# Altium footprint library ref-packages.PCBLIB: 1544 footprints (part 66 of 103)
Each footprint in its own frame and in the unit in brackets; x right, y up, seen from the top. Pads: shape width x height; smd on the part's side, far side on the other; paste and mask are expansions set on the pad; w line width, h text height; cw(c..) or ccw(c..) is an arc to the next point about the centre after c.
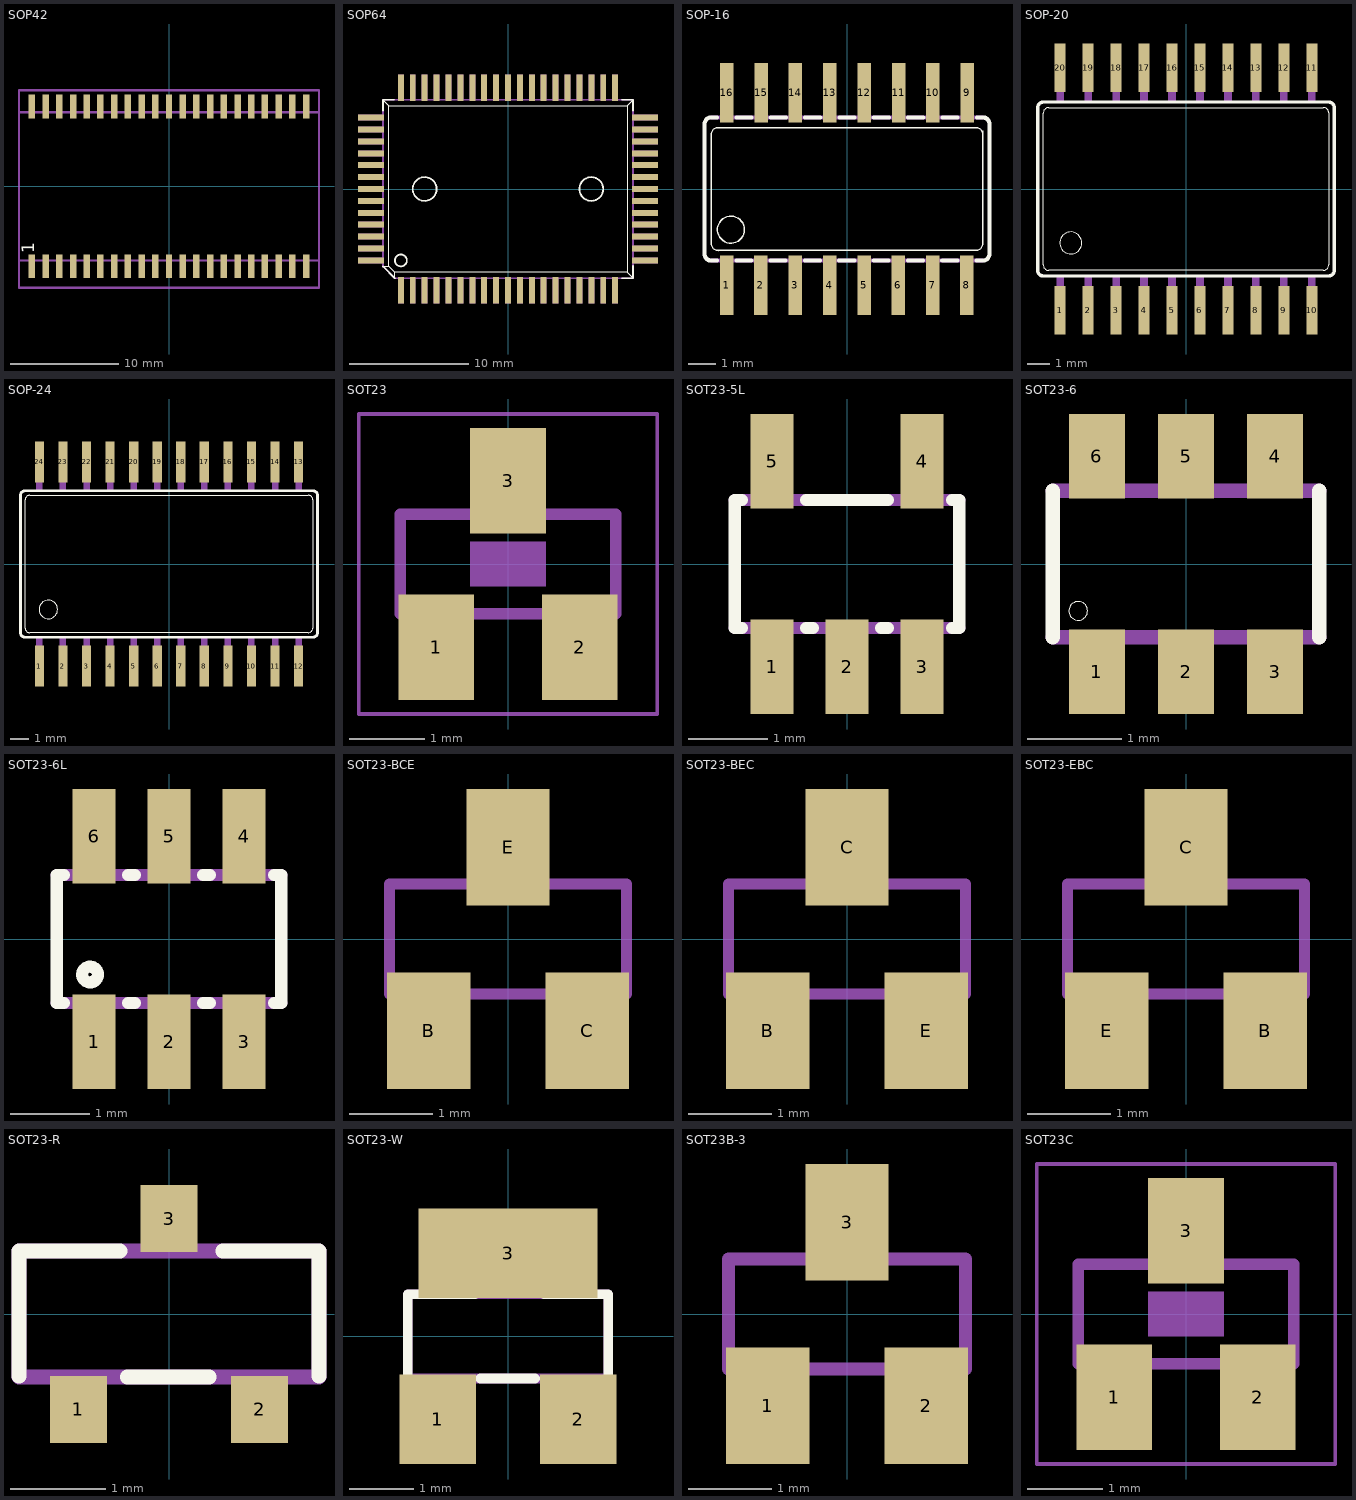
[diagram p65: the footprints below, top view; thin cyan lines are the x and y axes]

## SOP42 [mil]
pads (42):
  rect 23.62x86.61 smd: 1(-500,-291.34) 2(-450,-291.34) 3(-400,-291.34) 4(-350,-291.34) 5(-300,-291.34) 6(-250,-291.34) 7(-200,-291.34) 8(-150,-291.34) 9(-100,-291.34) 10(-50,-291.34) 11(0,-291.34) 12(50,-291.34) 13(100,-291.34) 14(150,-291.34) 15(200,-291.34) 16(250,-291.34) 17(300,-291.34) 18(350,-291.34) 19(400,-291.34) 20(450,-291.34) 21(500,-291.34) 22(500,291.34) 23(450,291.34) 24(400,291.34) 25(350,291.34) 26(300,291.34) 27(250,291.34) 28(200,291.34) 29(150,291.34) 30(100,291.34) 31(50,291.34) 32(0,291.34) 33(-50,291.34) 34(-100,291.34) 35(-150,291.34) 36(-200,291.34) 37(-250,291.34) 38(-300,291.34) 39(-350,291.34) 40(-400,291.34) 41(-450,291.34) 42(-500,291.34)
Top Overlay:
  text "1" at -475,-244.69 h77.5
Mechanical 16:
  rectangle: -509.65,-324.8 -490.35,-274.41
  rectangle: -459.65,-324.8 -440.35,-274.41
  rectangle: -409.65,-324.8 -390.35,-274.41
  rectangle: -359.65,-324.8 -340.35,-274.41
  rectangle: -309.65,-324.8 -290.35,-274.41
  rectangle: -259.65,-324.8 -240.35,-274.41
  rectangle: -209.65,-324.8 -190.35,-274.41
  rectangle: -159.65,-324.8 -140.35,-274.41
  rectangle: -109.65,-324.8 -90.35,-274.41
  rectangle: -59.65,-324.8 -40.35,-274.41
  rectangle: -9.65,-324.8 9.65,-274.41
  rectangle: 40.35,-324.8 59.65,-274.41
  rectangle: 90.35,-324.8 109.65,-274.41
  rectangle: 140.35,-324.8 159.65,-274.41
  rectangle: 190.35,-324.8 209.65,-274.41
  rectangle: 240.35,-324.8 259.65,-274.41
  rectangle: 290.35,-324.8 309.65,-274.41
  rectangle: 340.35,-324.8 359.65,-274.41
  rectangle: 390.35,-324.8 409.65,-274.41
  rectangle: 440.35,-324.8 459.65,-274.41
  rectangle: 490.35,-324.8 509.65,-274.41
  rectangle: 490.35,274.41 509.65,324.8
  rectangle: 440.35,274.41 459.65,324.8
  rectangle: 390.35,274.41 409.65,324.8
  rectangle: 340.35,274.41 359.65,324.8
  rectangle: 290.35,274.41 309.65,324.8
  rectangle: 240.35,274.41 259.65,324.8
  rectangle: 190.35,274.41 209.65,324.8
  rectangle: 140.35,274.41 159.65,324.8
  rectangle: 90.35,274.41 109.65,324.8
  rectangle: 40.35,274.41 59.65,324.8
  rectangle: -9.65,274.41 9.65,324.8
  rectangle: -59.65,274.41 -40.35,324.8
  rectangle: -109.65,274.41 -90.35,324.8
  rectangle: -159.65,274.41 -140.35,324.8
  rectangle: -209.65,274.41 -190.35,324.8
  rectangle: -259.65,274.41 -240.35,324.8
  rectangle: -309.65,274.41 -290.35,324.8
  rectangle: -359.65,274.41 -340.35,324.8
  rectangle: -409.65,274.41 -390.35,324.8
  rectangle: -459.65,274.41 -440.35,324.8
  rectangle: -509.65,274.41 -490.35,324.8
  lines w8: -547.24,-270.47 547.24,-270.47 547.24,270.47 -547.24,270.47 -547.24,-270.47
Mechanical 27:
  lines w7.87: -547.24,-370.08 -547.24,350.39 547.24,350.39 547.24,-370.08 -547.24,-370.08

## SOP64 [mm]
pads (64):
  rect 0.5x2.2 smd: 1(-9,-8.5) 2(-8,-8.5) 3(-7,-8.5) 4(-6,-8.5) 5(-5,-8.5) 6(-4,-8.5) 7(-3,-8.5) 8(-2,-8.5) 9(-1,-8.5) 10(0,-8.5) 11(1,-8.5) 12(2,-8.5) 13(3,-8.5) 14(4,-8.5) 15(5,-8.5) 16(6,-8.5) 17(7,-8.5) 18(8,-8.5) 19(9,-8.5) 33(9,8.5) 34(8,8.5) 35(7,8.5) 36(6,8.5) 37(5,8.5) 38(4,8.5) 39(3,8.5) 40(2,8.5) 41(1,8.5) 42(0,8.5) 43(-1,8.5) 44(-2,8.5) 45(-3,8.5) 46(-4,8.5) 47(-5,8.5) 48(-6,8.5) 49(-7,8.5) 50(-8,8.5) 51(-9,8.5)
  rect 2.2x0.5 smd: 20(11.5,-6) 21(11.5,-5) 22(11.5,-4) 23(11.5,-3) 24(11.5,-2) 25(11.5,-1) 26(11.5,0) 27(11.5,1) 28(11.5,2) 29(11.5,3) 30(11.5,4) 31(11.5,5) 32(11.5,6) 52(-11.5,6) 53(-11.5,5) 54(-11.5,4) 55(-11.5,3) 56(-11.5,2) 57(-11.5,1) 58(-11.5,0) 59(-11.5,-1) 60(-11.5,-2) 61(-11.5,-3) 62(-11.5,-4) 63(-11.5,-5) 64(-11.5,-6)
Top Overlay:
  circle w0.152: c-9,-6 r0.5
  circle w0.152: c-7,0 r1
  circle w0.152: c7,0 r1
  lines w0.051: -10.5,-6.5 -10,-6.5 ; -10.5,7.5 -10,7 ; -9.5,-7.5 -9.5,-7 ; 10.5,-7.5 10,-7 ; 10.5,7.5 10,7 ; -10,-6.5 -9.5,-7 ; -10,-6.5 -10,7 ; -10,7 10,7 ; -9.5,-7 10,-7 ; 10,-7 10,7
  lines w0.152: -10.5,-6.5 -9.5,-7.5 ; -10.5,6.581 -10.5,7.5 -9.566,7.5 ; 9.55,-7.5 10.5,-7.5 10.5,-6.47 ; 9.566,7.5 10.5,7.5 10.5,6.597
Mechanical 16:
  rectangle: -9.25,7.55 -8.75,9.6
  rectangle: -8.25,7.55 -7.75,9.6
  rectangle: -7.25,7.55 -6.75,9.6
  rectangle: -6.25,7.55 -5.75,9.6
  rectangle: -5.25,7.55 -4.75,9.6
  rectangle: -4.25,7.55 -3.75,9.6
  rectangle: -3.25,7.55 -2.75,9.6
  rectangle: -2.25,7.55 -1.75,9.6
  rectangle: -1.25,7.55 -0.75,9.6
  rectangle: -0.25,7.55 0.25,9.6
  rectangle: 0.75,7.55 1.25,9.6
  rectangle: 1.75,7.55 2.25,9.6
  rectangle: 2.75,7.55 3.25,9.6
  rectangle: 3.75,7.55 4.25,9.6
  rectangle: 4.75,7.55 5.25,9.6
  rectangle: 5.75,7.55 6.25,9.6
  rectangle: 6.75,7.55 7.25,9.6
  rectangle: 7.75,7.55 8.25,9.6
  rectangle: 8.75,7.55 9.25,9.6
  rectangle: 10.55,5.75 12.6,6.25
  rectangle: 10.55,4.75 12.6,5.25
  rectangle: 10.55,3.75 12.6,4.25
  rectangle: 10.55,2.75 12.6,3.25
  rectangle: 10.55,1.75 12.6,2.25
  rectangle: 10.55,0.75 12.6,1.25
  rectangle: 10.55,-0.25 12.6,0.25
  rectangle: 10.55,-1.25 12.6,-0.75
  rectangle: 10.55,-2.25 12.6,-1.75
  rectangle: 10.55,-3.25 12.6,-2.75
  rectangle: 10.55,-4.25 12.6,-3.75
  rectangle: 10.55,-5.25 12.6,-4.75
  rectangle: 10.55,-6.25 12.6,-5.75
  rectangle: 8.75,-9.6 9.25,-7.55
  rectangle: 7.75,-9.6 8.25,-7.55
  rectangle: 6.75,-9.6 7.25,-7.55
  rectangle: 5.75,-9.6 6.25,-7.55
  rectangle: 4.75,-9.6 5.25,-7.55
  rectangle: 3.75,-9.6 4.25,-7.55
  rectangle: 2.75,-9.6 3.25,-7.55
  rectangle: 1.75,-9.6 2.25,-7.55
  rectangle: 0.75,-9.6 1.25,-7.55
  rectangle: -0.25,-9.6 0.25,-7.55
  rectangle: -1.25,-9.6 -0.75,-7.55
  rectangle: -2.25,-9.6 -1.75,-7.55
  rectangle: -3.25,-9.6 -2.75,-7.55
  rectangle: -4.25,-9.6 -3.75,-7.55
  rectangle: -5.25,-9.6 -4.75,-7.55
  rectangle: -6.25,-9.6 -5.75,-7.55
  rectangle: -7.25,-9.6 -6.75,-7.55
  rectangle: -8.25,-9.6 -7.75,-7.55
  rectangle: -9.25,-9.6 -8.75,-7.55
  rectangle: -12.6,-6.25 -10.55,-5.75
  rectangle: -12.6,-5.25 -10.55,-4.75
  rectangle: -12.6,-4.25 -10.55,-3.75
  rectangle: -12.6,-3.25 -10.55,-2.75
  rectangle: -12.6,-2.25 -10.55,-1.75
  rectangle: -12.6,-1.25 -10.55,-0.75
  rectangle: -12.6,-0.25 -10.55,0.25
  rectangle: -12.6,0.75 -10.55,1.25
  rectangle: -12.6,1.75 -10.55,2.25
  rectangle: -12.6,2.75 -10.55,3.25
  rectangle: -12.6,3.75 -10.55,4.25
  rectangle: -12.6,4.75 -10.55,5.25
  rectangle: -12.6,5.75 -10.55,6.25
  lines w0.152: -10.5,-6.5 -10.5,7.5 10.5,7.5 10.5,-7.5 -9.5,-7.5 -10.5,-6.5

## SOP-16 [mil]
pads (16):
  rect 19.69x86.61 smd: 1(-175,-139.76) 2(-125.39,-139.76) 3(-75.39,-139.76) 4(-25.39,-139.76) 5(25,-139.76) 6(74.61,-139.76) 7(124.61,-139.76) 8(174.61,-139.76) 9(175,139.76) 10(125,139.76) 11(75,139.76) 12(25,139.76) 13(-25,139.76) 14(-75,139.76) 15(-125,139.76) 16(-175,139.76)
Top Overlay:
  circle w2: c-168.9,-59.06 r19.69
  lines w2: -187.8,-89.49 187.6,-89.49 ccw(c187.6,-79.65) 197.44,-79.65 197.44,79.65 ; -187.6,-89.61 cw(c-187.59,-79.77) -197.44,-79.76 -197.44,79.65 cw(c-187.59,79.65) -187.56,89.5 187.6,89.49 cw(c187.6,79.65) 197.44,79.65 ; 197.44,84.65 197.44,79.65
  lines w6: -198.82,104.33 -189.02,104.33 ; -197.44,-104.33 cw(c-197.54,-94.33) -197.64,-104.33 ; -197.44,104.33 ccw(c-197.44,94.49) -207.28,94.49 -207.28,-94.49 ccw(c-197.44,-94.49) -197.64,-104.33 ; -189.02,-104.33 -197.64,-104.33 ; -160.98,-104.33 -139.41,-104.33 ; -160.98,104.33 -139.02,104.33 ; -111.38,-104.33 -89.41,-104.33 ; -110.98,104.33 -89.02,104.33 ; -61.38,-104.33 -39.41,-104.33 ; -60.98,104.33 -39.02,104.33 ; -11.38,-104.33 10.98,-104.33 ; -10.98,104.33 10.98,104.33 ; 39.02,-104.33 60.59,-104.33 ; 39.02,104.33 60.98,104.33 ; 88.62,-104.33 110.59,-104.33 ; 89.02,104.33 110.98,104.33 ; 138.62,-104.33 160.59,-104.33 ; 139.02,104.33 160.98,104.33 ; 188.62,-104.33 197.24,-104.33 ; 189.02,104.33 197.64,104.33 ; 197.44,-104.33 ccw(c197.44,-94.49) 207.28,-94.49 207.28,94.49 ccw(c197.44,94.49) 197.64,104.33 ; 197.44,104.33 cw(c197.54,94.33) 197.64,104.33
Mechanical 16:
  rectangle: -182.87,104.33 -167.13,159.45
  rectangle: -132.87,104.33 -117.13,159.45
  rectangle: -82.87,104.33 -67.13,159.45
  rectangle: -32.87,104.33 -17.13,159.45
  rectangle: 17.13,104.33 32.87,159.45
  rectangle: 67.13,104.33 82.87,159.45
  rectangle: 117.13,104.33 132.87,159.45
  rectangle: 167.13,104.33 182.87,159.45
  rectangle: 166.73,-159.45 182.48,-104.33
  rectangle: 116.73,-159.45 132.48,-104.33
  rectangle: 66.73,-159.45 82.48,-104.33
  rectangle: 17.13,-159.45 32.87,-104.33
  rectangle: -33.27,-159.45 -17.52,-104.33
  rectangle: -83.27,-159.45 -67.52,-104.33
  rectangle: -133.27,-159.45 -117.52,-104.33
  rectangle: -182.87,-159.45 -167.13,-104.33
  lines w6: -197.44,-104.33 197.44,-104.33 ; -197.44,104.33 197.44,104.33

## SOP-20 [mil]
pads (20):
  rect 19.69x86.61 smd: 1(-225,-216.54) 2(-175,-216.54) 3(-125,-216.54) 4(-75,-216.54) 5(-25,-216.54) 6(25,-216.54) 7(75,-216.54) 8(125,-216.54) 9(175,-216.54) 10(225,-216.54) 11(225,216.54) 12(175,216.54) 13(125,216.54) 14(75,216.54) 15(25,216.54) 16(-25,216.54) 17(-75,216.54) 18(-125,216.54) 19(-175,216.54) 20(-225,216.54)
Top Overlay:
  circle w2: c-206.1,-96.46 r19.69
  lines w2: -255.32,-135.83 -255.32,135.83 cw(c-245.47,135.82) -245.47,145.67 245.87,145.67 cw(c245.67,136.02) 255.32,136.22 255.32,-135.83 cw(c245.47,-135.82) 245.47,-145.67 -245.47,-145.67 cw(c-245.47,-135.82) -255.32,-135.83
  lines w6: -255.35,155.51 -255.32,155.51 ; -255.32,155.51 255.32,155.51 cw(c255.32,145.67) 265.16,145.67 265.16,-145.67 cw(c255.32,-145.67) 255.32,-155.51 -255.32,-155.51 cw(c-255.33,-145.67) -265.16,-146.06 -265.16,145.67 cw(c-255.32,145.67) -255.32,155.51
Mechanical 16:
  rectangle: -231.89,155.51 -218.11,236.22
  rectangle: -181.89,155.51 -168.11,236.22
  rectangle: -131.89,155.51 -118.11,236.22
  rectangle: -81.89,155.51 -68.11,236.22
  rectangle: -31.89,155.51 -18.11,236.22
  rectangle: 18.11,155.51 31.89,236.22
  rectangle: 68.11,155.51 81.89,236.22
  rectangle: 118.11,155.51 131.89,236.22
  rectangle: 168.11,155.51 181.89,236.22
  rectangle: 218.11,155.51 231.89,236.22
  rectangle: -231.89,-236.22 -218.11,-155.51
  rectangle: -181.89,-236.22 -168.11,-155.51
  rectangle: -131.89,-236.22 -118.11,-155.51
  rectangle: -81.89,-236.22 -68.11,-155.51
  rectangle: -31.89,-236.22 -18.11,-155.51
  rectangle: 18.11,-236.22 31.89,-155.51
  rectangle: 68.11,-236.22 81.89,-155.51
  rectangle: 118.11,-236.22 131.89,-155.51
  rectangle: 168.11,-236.22 181.89,-155.51
  rectangle: 218.11,-236.22 231.89,-155.51

## SOP-24 [mil]
pads (24):
  rect 19.69x86.61 smd: 1(-275,-216.54) 2(-225,-216.54) 3(-175,-216.54) 4(-125,-216.54) 5(-75,-216.54) 6(-25,-216.54) 7(25,-216.54) 8(75,-216.54) 9(125,-216.54) 10(175,-216.54) 11(225,-216.54) 12(275,-216.54) 13(275,216.54) 14(225,216.54) 15(175,216.54) 16(125,216.54) 17(75,216.54) 18(25,216.54) 19(-25,216.54) 20(-75,216.54) 21(-125,216.54) 22(-175,216.54) 23(-225,216.54) 24(-275,216.54)
Top Overlay:
  circle w2: c-256.1,-96.46 r19.69
  lines w2: -305.32,-135.83 -305.32,135.83 cw(c-295.48,135.82) -295.47,145.67 295.87,145.67 cw(c295.67,136.02) 305.32,136.22 305.32,-135.83 cw(c295.48,-135.82) 295.47,-145.67 -295.47,-145.67 cw(c-295.48,-135.82) -305.32,-135.83
  lines w6: -305.35,155.51 -305.32,155.51 ; -305.32,155.51 305.32,155.51 cw(c305.32,145.67) 315.16,145.67 315.16,-145.67 cw(c305.32,-145.67) 305.32,-155.51 -305.32,-155.51 cw(c-305.33,-145.67) -315.16,-146.06 -315.16,145.67 cw(c-305.32,145.67) -305.32,155.51
Mechanical 16:
  rectangle: -281.89,155.51 -268.11,236.22
  rectangle: -231.89,155.51 -218.11,236.22
  rectangle: -181.89,155.51 -168.11,236.22
  rectangle: -131.89,155.51 -118.11,236.22
  rectangle: -81.89,155.51 -68.11,236.22
  rectangle: -31.89,155.51 -18.11,236.22
  rectangle: 18.11,155.51 31.89,236.22
  rectangle: 68.11,155.51 81.89,236.22
  rectangle: 118.11,155.51 131.89,236.22
  rectangle: 168.11,155.51 181.89,236.22
  rectangle: 218.11,155.51 231.89,236.22
  rectangle: 268.11,155.51 281.89,236.22
  rectangle: -281.89,-236.22 -268.11,-155.51
  rectangle: -231.89,-236.22 -218.11,-155.51
  rectangle: -181.89,-236.22 -168.11,-155.51
  rectangle: -131.89,-236.22 -118.11,-155.51
  rectangle: -81.89,-236.22 -68.11,-155.51
  rectangle: -31.89,-236.22 -18.11,-155.51
  rectangle: 18.11,-236.22 31.89,-155.51
  rectangle: 68.11,-236.22 81.89,-155.51
  rectangle: 118.11,-236.22 131.89,-155.51
  rectangle: 168.11,-236.22 181.89,-155.51
  rectangle: 218.11,-236.22 231.89,-155.51
  rectangle: 268.11,-236.22 281.89,-155.51

## SOT23 [mm]
pads (3):
  rect 1x1.4 smd: 1(-0.95,-1.1) 2(0.95,-1.1) 3(0,1.1)
Mechanical 6:
  rectangle: -0.5,-0.3 0.5,0.3
Mechanical 16:
  rectangle: -0.229,0.711 0.229,1.295
  rectangle: 0.711,-1.295 1.168,-0.711
  rectangle: -1.168,-1.295 -0.711,-0.711
  lines w0.152: -1.422,-0.66 1.422,-0.66 1.422,0.66 -1.422,0.66 -1.422,-0.66
Mechanical 27:
  lines w0.051: -1.973,-1.983 1.973,-1.983 1.973,1.983 -1.973,1.983 -1.973,-1.983

## SOT23-5L [mil]
pads (5):
  rect 21.65x47.24 smd: 1(-37.4,-51.18) 2(0,-51.18) 3(37.4,-51.18) 4(37.4,51.18) 5(-37.4,51.18)
Top Overlay:
  lines w6: -52.28,-31.89 -55.98,-31.89 -55.98,31.89 -52.28,31.89 ; -20.55,-31.89 -16.85,-31.89 ; -20.55,31.89 20.55,31.89 ; 16.85,-31.89 20.55,-31.89 ; 52.28,-31.89 55.98,-31.89 55.98,31.89 52.28,31.89
Mechanical 16:
  rectangle: -47.24,-59.06 -27.56,-33.46
  rectangle: -9.84,-59.06 9.84,-33.46
  rectangle: 27.56,-59.06 47.24,-33.46
  rectangle: 27.56,33.46 47.24,59.06
  rectangle: -47.24,33.46 -27.56,59.06
  lines w6: -55.98,-31.89 55.98,-31.89 ; -55.98,31.89 55.98,31.89

## SOT23-6 [mil]
pads (6):
  rect 23.62x35.43 smd: 1(-37.4,-45.28) 2(0,-45.28) 3(37.4,-45.28) 4(37.4,45.28) 5(0,45.28) 6(-37.4,45.28)
Top Overlay:
  circle w0: c-45.28,-19.69 r3.94
  lines w6: -56.02,-30.75 -56.02,30.75 ; 55.98,-30.75 55.98,30.75
Mechanical 16:
  rectangle: -47.24,-55.12 -27.56,-31.5
  rectangle: -9.84,-55.12 9.84,-31.5
  rectangle: 27.56,-55.12 47.24,-31.5
  rectangle: 27.56,31.5 47.24,55.12
  rectangle: -9.84,31.5 9.84,55.12
  rectangle: -47.24,31.5 -27.56,55.12
  lines w6: -56.02,-30.75 55.98,-30.75 ; -56.02,30.75 55.98,30.75

## SOT23-6L [mil]
pads (6):
  rect 21.65x47.24 smd: 1(-37.4,-51.18) 2(0,-51.18) 3(37.4,-51.18) 4(37.4,51.18) 5(0,51.18) 6(-37.4,51.18)
Top Overlay:
  circle w6: c-39.37,-17.72 r3.94
  lines w6: -52.28,-31.89 -55.98,-31.89 -55.98,31.89 -52.28,31.89 ; -20.55,-31.89 -16.85,-31.89 ; -20.55,31.89 -16.85,31.89 ; 16.85,-31.89 20.55,-31.89 ; 16.85,31.89 20.55,31.89 ; 52.28,-31.89 55.98,-31.89 55.98,31.89 52.28,31.89
Mechanical 16:
  rectangle: -47.24,-59.06 -27.56,-33.46
  rectangle: -9.84,-59.06 9.84,-33.46
  rectangle: 27.56,-59.06 47.24,-33.46
  rectangle: 27.56,33.46 47.24,59.06
  rectangle: -9.84,33.46 9.84,59.06
  rectangle: -47.24,33.46 -27.56,59.06
  lines w6: -55.98,-31.89 55.98,-31.89 ; -55.98,31.89 55.98,31.89

## SOT23-BCE [mm]
pads (3):
  rect 1x1.4 smd: B(-0.95,-1.1) C(0.95,-1.1) E(0,1.1)
Mechanical 16:
  rectangle: -0.229,0.711 0.229,1.295
  rectangle: 0.711,-1.295 1.168,-0.711
  rectangle: -1.168,-1.295 -0.711,-0.711
  lines w0.127: -1.422,-0.66 1.422,-0.66 1.422,0.66 -1.422,0.66 -1.422,-0.66

## SOT23-BEC [mm]
pads (3):
  rect 1x1.4 smd: B(-0.95,-1.1) C(0,1.1) E(0.95,-1.1)
Mechanical 16:
  rectangle: -0.229,0.711 0.229,1.295
  rectangle: 0.711,-1.295 1.168,-0.711
  rectangle: -1.168,-1.295 -0.711,-0.711
  lines w0.127: -1.422,-0.66 1.422,-0.66 1.422,0.66 -1.422,0.66 -1.422,-0.66

## SOT23-EBC [mm]
pads (3):
  rect 1x1.4 smd: B(0.95,-1.1) C(0,1.1) E(-0.95,-1.1)
Mechanical 16:
  rectangle: -0.229,0.711 0.229,1.295
  rectangle: 0.711,-1.295 1.168,-0.711
  rectangle: -1.168,-1.295 -0.711,-0.711
  lines w0.127: -1.422,-0.66 1.422,-0.66 1.422,0.66 -1.422,0.66 -1.422,-0.66

## SOT23-R [mm]
pads (3):
  rect 0.6x0.7 smd: 1(-0.95,-1) 2(0.95,-1) 3(0,1)
Top Overlay:
  lines w0.152: -1.573,-0.653 -1.573,0.66 -0.514,0.66 ; -0.436,-0.66 0.422,-0.66 ; 0.564,0.66 1.573,0.66 1.573,-0.653
Mechanical 16:
  rectangle: -0.229,0.711 0.229,1.295
  rectangle: 0.711,-1.295 1.168,-0.711
  rectangle: -1.168,-1.295 -0.711,-0.711
  lines w0.152: -1.573,-0.66 1.573,-0.66 1.573,0.66 -1.573,0.66 -1.573,-0.66

## SOT23-W [mil]
pads (3):
  rect 47.24x55.12 smd: 1(-43.31,-51.18) 2(43.31,-51.18)
  rect 110.24x55.12 smd: 3(0,51.18)
Top Overlay:
  lines w6: -61.91,-25.69 -61.91,26 -20.22,26 ; -17.18,-26 16.63,-26 ; 22.19,26 61.91,26 61.91,-25.69
Mechanical 16:
  rectangle: -9,28 9,51
  rectangle: 28,-51 46,-28
  rectangle: -46,-51 -28,-28
  lines w6: -61.91,-26 61.91,-26 61.91,26 -61.91,26 -61.91,-26

## SOT23B-3 [mm]
pads (3):
  rect 1x1.4 smd: 1(-0.95,-1.1) 2(0.95,-1.1) 3(0,1.1)
Mechanical 16:
  rectangle: -0.229,0.711 0.229,1.295
  rectangle: 0.711,-1.295 1.168,-0.711
  rectangle: -1.168,-1.295 -0.711,-0.711
  lines w0.152: -1.422,-0.66 1.422,-0.66 1.422,0.66 -1.422,0.66 -1.422,-0.66

## SOT23C [mm]
pads (3):
  rect 1x1.4 smd: 1(-0.95,-1.1) 2(0.95,-1.1) 3(0,1.1)
Mechanical 6:
  rectangle: -0.5,-0.3 0.5,0.3
Mechanical 16:
  rectangle: -0.229,0.711 0.229,1.295
  rectangle: 0.711,-1.295 1.168,-0.711
  rectangle: -1.168,-1.295 -0.711,-0.711
  lines w0.152: -1.422,-0.66 1.422,-0.66 1.422,0.66 -1.422,0.66 -1.422,-0.66
Mechanical 27:
  lines w0.051: -1.973,-1.983 1.973,-1.983 1.973,1.983 -1.973,1.983 -1.973,-1.983